# Altium schematic symbol library jlcpcb_2025_04_resistors_extended_2512.schlib: 2667 symbols (part 10 of 14) (continued)
## RC-12K302JT
designator R?  Resistance: 3kΩ  (hidden comment: *)
Resistor, 3kΩ, ±5%, 1W, ±100ppm/℃, SMD 2512; Manufacturer: Uniroyal; Manufacturer Part Number: RC-12K302JT; Supplier 1: LCSC; Supplier Part Number 1: C453450; JLCPCB Part Number: C453450; Power Rating: 1W; Category: Resistors; Package Size: 2512; JLCPCB Basic Part: Yes; Tolerance: ±5%; Temperature Coefficient: ±100ppm/℃; ComponentLink1Description: Datasheet; ComponentLink1URL: https://wmsc.lcsc.com/wmsc/upload/file/pdf/v2/lcsc/2304140030_FH--Guangdong-Fenghua-Advanced-Tech-RC-12K302JT_C453450.pdf; ComponentLink2Description: JLCPCB Part URL; ComponentLink2URL: https://jlcpcb.com/partdetail/C453450
pins: 1, 2
1 alternate drawing of the same symbol

## RC-12K303JT
designator R?  Resistance: 30kΩ  (hidden comment: *)
Resistor, 30kΩ, ±5%, 1W, ±100ppm/℃, SMD 2512; Manufacturer: Uniroyal; Manufacturer Part Number: RC-12K303JT; Supplier 1: LCSC; Supplier Part Number 1: C453451; JLCPCB Part Number: C453451; Power Rating: 1W; Category: Resistors; Package Size: 2512; JLCPCB Basic Part: Yes; Tolerance: ±5%; Temperature Coefficient: ±100ppm/℃; ComponentLink1Description: Datasheet; ComponentLink1URL: https://wmsc.lcsc.com/wmsc/upload/file/pdf/v2/lcsc/2304140030_FH--Guangdong-Fenghua-Advanced-Tech-RC-12K303JT_C453451.pdf; ComponentLink2Description: JLCPCB Part URL; ComponentLink2URL: https://jlcpcb.com/partdetail/C453451
pins: 1, 2
1 alternate drawing of the same symbol

## RC-12K304JT
designator R?  Resistance: 300kΩ  (hidden comment: *)
Resistor, 300kΩ, ±5%, 1W, ±100ppm/℃, SMD 2512; Manufacturer: Uniroyal; Manufacturer Part Number: RC-12K304JT; Supplier 1: LCSC; Supplier Part Number 1: C453452; JLCPCB Part Number: C453452; Power Rating: 1W; Category: Resistors; Package Size: 2512; JLCPCB Basic Part: Yes; Tolerance: ±5%; Temperature Coefficient: ±100ppm/℃; ComponentLink1Description: Datasheet; ComponentLink1URL: https://wmsc.lcsc.com/wmsc/upload/file/pdf/v2/lcsc/2304140030_FH--Guangdong-Fenghua-Advanced-Tech-RC-12K304JT_C453452.pdf; ComponentLink2Description: JLCPCB Part URL; ComponentLink2URL: https://jlcpcb.com/partdetail/C453452
pins: 1, 2
1 alternate drawing of the same symbol

## RC-12K330JT
designator R?  Resistance: 33Ω  (hidden comment: *)
Resistor, 33Ω, ±5%, 1W, 200V, ±100ppm/℃, -55℃~+155℃, SMD 2512; Manufacturer: Uniroyal; Manufacturer Part Number: RC-12K330JT; Supplier 1: LCSC; Supplier Part Number 1: C453458; JLCPCB Part Number: C453458; Power Rating: 1W; Category: Resistors; Package Size: 2512; JLCPCB Basic Part: Yes; Tolerance: ±5%; Voltage Rating: 200V; Temperature Coefficient: ±100ppm/℃; Temperature Rating: -55℃~+155℃; ComponentLink1Description: Datasheet; ComponentLink1URL: https://wmsc.lcsc.com/wmsc/upload/file/pdf/v2/lcsc/2304140030_FH--Guangdong-Fenghua-Advanced-Tech-RC-12K330JT_C453458.pdf; ComponentLink2Description: JLCPCB Part URL; ComponentLink2URL: https://jlcpcb.com/partdetail/C453458
pins: 1, 2
1 alternate drawing of the same symbol

## RC-12K331JT
designator R?  Resistance: 330Ω  (hidden comment: *)
Resistor, 330Ω, ±5%, 1W, ±100ppm/℃, SMD 2512; Manufacturer: Uniroyal; Manufacturer Part Number: RC-12K331JT; Supplier 1: LCSC; Supplier Part Number 1: C304648; JLCPCB Part Number: C304648; Power Rating: 1W; Category: Resistors; Package Size: 2512; JLCPCB Basic Part: Yes; Tolerance: ±5%; Temperature Coefficient: ±100ppm/℃; ComponentLink1Description: Datasheet; ComponentLink1URL: https://wmsc.lcsc.com/wmsc/upload/file/pdf/v2/lcsc/2304140030_FH--Guangdong-Fenghua-Advanced-Tech-RC-12K331JT_C304648.pdf; ComponentLink2Description: JLCPCB Part URL; ComponentLink2URL: https://jlcpcb.com/partdetail/C304648
pins: 1, 2
1 alternate drawing of the same symbol

## RC-12K332JT
designator R?  Resistance: 3.3kΩ  (hidden comment: *)
Resistor, 3.3kΩ, ±5%, 1W, ±100ppm/℃, SMD 2512; Manufacturer: Uniroyal; Manufacturer Part Number: RC-12K332JT; Supplier 1: LCSC; Supplier Part Number 1: C453989; JLCPCB Part Number: C453989; Power Rating: 1W; Category: Resistors; Package Size: 2512; JLCPCB Basic Part: Yes; Tolerance: ±5%; Temperature Coefficient: ±100ppm/℃; ComponentLink1Description: Datasheet; ComponentLink1URL: https://wmsc.lcsc.com/wmsc/upload/file/pdf/v2/lcsc/2304140030_FH--Guangdong-Fenghua-Advanced-Tech-RC-12K332JT_C453989.pdf; ComponentLink2Description: JLCPCB Part URL; ComponentLink2URL: https://jlcpcb.com/partdetail/C453989
pins: 1, 2
1 alternate drawing of the same symbol

## RC-12K333JT
designator R?  Resistance: 33kΩ  (hidden comment: *)
Resistor, 33kΩ, ±5%, 1W, ±100ppm/℃, SMD 2512; Manufacturer: Uniroyal; Manufacturer Part Number: RC-12K333JT; Supplier 1: LCSC; Supplier Part Number 1: C453990; JLCPCB Part Number: C453990; Power Rating: 1W; Category: Resistors; Package Size: 2512; JLCPCB Basic Part: Yes; Tolerance: ±5%; Temperature Coefficient: ±100ppm/℃; ComponentLink1Description: Datasheet; ComponentLink1URL: https://wmsc.lcsc.com/wmsc/upload/file/pdf/v2/lcsc/2304140030_FH--Guangdong-Fenghua-Advanced-Tech-RC-12K333JT_C453990.pdf; ComponentLink2Description: JLCPCB Part URL; ComponentLink2URL: https://jlcpcb.com/partdetail/C453990
pins: 1, 2
1 alternate drawing of the same symbol

## RC-12K334JT
designator R?  Resistance: 330kΩ  (hidden comment: *)
Resistor, 330kΩ, ±5%, 1W, ±100ppm/℃, SMD 2512; Manufacturer: Uniroyal; Manufacturer Part Number: RC-12K334JT; Supplier 1: LCSC; Supplier Part Number 1: C453991; JLCPCB Part Number: C453991; Power Rating: 1W; Category: Resistors; Package Size: 2512; JLCPCB Basic Part: Yes; Tolerance: ±5%; Temperature Coefficient: ±100ppm/℃; ComponentLink1Description: Datasheet; ComponentLink1URL: https://wmsc.lcsc.com/wmsc/upload/file/pdf/v2/lcsc/2304140030_FH--Guangdong-Fenghua-Advanced-Tech-RC-12K334JT_C453991.pdf; ComponentLink2Description: JLCPCB Part URL; ComponentLink2URL: https://jlcpcb.com/partdetail/C453991
pins: 1, 2
1 alternate drawing of the same symbol

## RC-12K361JT
designator R?  Resistance: 360Ω  (hidden comment: *)
Resistor, 360Ω, ±5%, 1W, 200V, ±100ppm/℃, -55℃~+155℃, SMD 2512; Manufacturer: Uniroyal; Manufacturer Part Number: RC-12K361JT; Supplier 1: LCSC; Supplier Part Number 1: C575453; JLCPCB Part Number: C575453; Power Rating: 1W; Category: Resistors; Package Size: 2512; JLCPCB Basic Part: Yes; Tolerance: ±5%; Voltage Rating: 200V; Temperature Coefficient: ±100ppm/℃; Temperature Rating: -55℃~+155℃; ComponentLink1Description: Datasheet; ComponentLink2Description: JLCPCB Part URL; ComponentLink2URL: https://jlcpcb.com/partdetail/C575453
pins: 1, 2
1 alternate drawing of the same symbol

## RC-12K362JT
designator R?  Resistance: 3.6kΩ  (hidden comment: *)
Resistor, 3.6kΩ, ±5%, 1W, ±100ppm/℃, SMD 2512; Manufacturer: Uniroyal; Manufacturer Part Number: RC-12K362JT; Supplier 1: LCSC; Supplier Part Number 1: C453993; JLCPCB Part Number: C453993; Power Rating: 1W; Category: Resistors; Package Size: 2512; JLCPCB Basic Part: Yes; Tolerance: ±5%; Temperature Coefficient: ±100ppm/℃; ComponentLink1Description: Datasheet; ComponentLink1URL: https://wmsc.lcsc.com/wmsc/upload/file/pdf/v2/lcsc/2304140030_FH--Guangdong-Fenghua-Advanced-Tech-RC-12K362JT_C453993.pdf; ComponentLink2Description: JLCPCB Part URL; ComponentLink2URL: https://jlcpcb.com/partdetail/C453993
pins: 1, 2
1 alternate drawing of the same symbol

## RC-12K363JT
designator R?  Resistance: 36kΩ  (hidden comment: *)
Resistor, 36kΩ, ±5%, 1W, ±100ppm/℃, SMD 2512; Manufacturer: Uniroyal; Manufacturer Part Number: RC-12K363JT; Supplier 1: LCSC; Supplier Part Number 1: C453994; JLCPCB Part Number: C453994; Power Rating: 1W; Category: Resistors; Package Size: 2512; JLCPCB Basic Part: Yes; Tolerance: ±5%; Temperature Coefficient: ±100ppm/℃; ComponentLink1Description: Datasheet; ComponentLink1URL: https://wmsc.lcsc.com/wmsc/upload/file/pdf/v2/lcsc/2304140030_FH--Guangdong-Fenghua-Advanced-Tech-RC-12K363JT_C453994.pdf; ComponentLink2Description: JLCPCB Part URL; ComponentLink2URL: https://jlcpcb.com/partdetail/C453994
pins: 1, 2
1 alternate drawing of the same symbol

## RC-12K390JT
designator R?  Resistance: 39Ω  (hidden comment: *)
Resistor, 39Ω, ±5%, 1W, ±100ppm/℃, SMD 2512; Manufacturer: Uniroyal; Manufacturer Part Number: RC-12K390JT; Supplier 1: LCSC; Supplier Part Number 1: C454001; JLCPCB Part Number: C454001; Power Rating: 1W; Category: Resistors; Package Size: 2512; JLCPCB Basic Part: Yes; Tolerance: ±5%; Temperature Coefficient: ±100ppm/℃; ComponentLink1Description: Datasheet; ComponentLink1URL: https://wmsc.lcsc.com/wmsc/upload/file/pdf/v2/lcsc/2304140030_FH--Guangdong-Fenghua-Advanced-Tech-RC-12K390JT_C454001.pdf; ComponentLink2Description: JLCPCB Part URL; ComponentLink2URL: https://jlcpcb.com/partdetail/C454001
pins: 1, 2
1 alternate drawing of the same symbol

## RC-12K391JT
designator R?  Resistance: 390Ω  (hidden comment: *)
Resistor, 390Ω, ±5%, 1W, ±100ppm/℃, SMD 2512; Manufacturer: Uniroyal; Manufacturer Part Number: RC-12K391JT; Supplier 1: LCSC; Supplier Part Number 1: C454002; JLCPCB Part Number: C454002; Power Rating: 1W; Category: Resistors; Package Size: 2512; JLCPCB Basic Part: Yes; Tolerance: ±5%; Temperature Coefficient: ±100ppm/℃; ComponentLink1Description: Datasheet; ComponentLink1URL: https://wmsc.lcsc.com/wmsc/upload/file/pdf/v2/lcsc/2304140030_FH--Guangdong-Fenghua-Advanced-Tech-RC-12K391JT_C454002.pdf; ComponentLink2Description: JLCPCB Part URL; ComponentLink2URL: https://jlcpcb.com/partdetail/C454002
pins: 1, 2
1 alternate drawing of the same symbol

## RC-12K392JT
designator R?  Resistance: 3.9kΩ  (hidden comment: *)
Resistor, 3.9kΩ, ±5%, 1W, ±100ppm/℃, SMD 2512; Manufacturer: Uniroyal; Manufacturer Part Number: RC-12K392JT; Supplier 1: LCSC; Supplier Part Number 1: C454003; JLCPCB Part Number: C454003; Power Rating: 1W; Category: Resistors; Package Size: 2512; JLCPCB Basic Part: Yes; Tolerance: ±5%; Temperature Coefficient: ±100ppm/℃; ComponentLink1Description: Datasheet; ComponentLink1URL: https://wmsc.lcsc.com/wmsc/upload/file/pdf/v2/lcsc/2304140030_FH--Guangdong-Fenghua-Advanced-Tech-RC-12K392JT_C454003.pdf; ComponentLink2Description: JLCPCB Part URL; ComponentLink2URL: https://jlcpcb.com/partdetail/C454003
pins: 1, 2
1 alternate drawing of the same symbol

## RC-12K393JT
designator R?  Resistance: 39kΩ  (hidden comment: *)
Resistor, 39kΩ, ±5%, 1W, ±100ppm/℃, SMD 2512; Manufacturer: Uniroyal; Manufacturer Part Number: RC-12K393JT; Supplier 1: LCSC; Supplier Part Number 1: C454004; JLCPCB Part Number: C454004; Power Rating: 1W; Category: Resistors; Package Size: 2512; JLCPCB Basic Part: Yes; Tolerance: ±5%; Temperature Coefficient: ±100ppm/℃; ComponentLink1Description: Datasheet; ComponentLink1URL: https://wmsc.lcsc.com/wmsc/upload/file/pdf/v2/lcsc/2304140030_FH--Guangdong-Fenghua-Advanced-Tech-RC-12K393JT_C454004.pdf; ComponentLink2Description: JLCPCB Part URL; ComponentLink2URL: https://jlcpcb.com/partdetail/C454004
pins: 1, 2
1 alternate drawing of the same symbol

## RC-12K430JT
designator R?  Resistance: 43Ω  (hidden comment: *)
Resistor, 43Ω, ±5%, 1W, ±100ppm/℃, SMD 2512; Manufacturer: Uniroyal; Manufacturer Part Number: RC-12K430JT; Supplier 1: LCSC; Supplier Part Number 1: C454008; JLCPCB Part Number: C454008; Power Rating: 1W; Category: Resistors; Package Size: 2512; JLCPCB Basic Part: Yes; Tolerance: ±5%; Temperature Coefficient: ±100ppm/℃; ComponentLink1Description: Datasheet; ComponentLink1URL: https://wmsc.lcsc.com/wmsc/upload/file/pdf/v2/lcsc/2304140030_FH--Guangdong-Fenghua-Advanced-Tech-RC-12K430JT_C454008.pdf; ComponentLink2Description: JLCPCB Part URL; ComponentLink2URL: https://jlcpcb.com/partdetail/C454008
pins: 1, 2
1 alternate drawing of the same symbol

## RC-12K431JT
designator R?  Resistance: 430Ω  (hidden comment: *)
Resistor, 430Ω, ±5%, 1W, ±100ppm/℃, SMD 2512; Manufacturer: Uniroyal; Manufacturer Part Number: RC-12K431JT; Supplier 1: LCSC; Supplier Part Number 1: C304649; JLCPCB Part Number: C304649; Power Rating: 1W; Category: Resistors; Package Size: 2512; JLCPCB Basic Part: Yes; Tolerance: ±5%; Temperature Coefficient: ±100ppm/℃; ComponentLink1Description: Datasheet; ComponentLink1URL: https://wmsc.lcsc.com/wmsc/upload/file/pdf/v2/lcsc/2304140030_FH--Guangdong-Fenghua-Advanced-Tech-RC-12K431JT_C304649.pdf; ComponentLink2Description: JLCPCB Part URL; ComponentLink2URL: https://jlcpcb.com/partdetail/C304649
pins: 1, 2
1 alternate drawing of the same symbol

## RC-12K432JT
designator R?  Resistance: 4.3kΩ  (hidden comment: *)
Resistor, 4.3kΩ, ±5%, 1W, ±100ppm/℃, SMD 2512; Manufacturer: Uniroyal; Manufacturer Part Number: RC-12K432JT; Supplier 1: LCSC; Supplier Part Number 1: C454009; JLCPCB Part Number: C454009; Power Rating: 1W; Category: Resistors; Package Size: 2512; JLCPCB Basic Part: Yes; Tolerance: ±5%; Temperature Coefficient: ±100ppm/℃; ComponentLink1Description: Datasheet; ComponentLink1URL: https://wmsc.lcsc.com/wmsc/upload/file/pdf/v2/lcsc/2304140030_FH--Guangdong-Fenghua-Advanced-Tech-RC-12K432JT_C454009.pdf; ComponentLink2Description: JLCPCB Part URL; ComponentLink2URL: https://jlcpcb.com/partdetail/C454009
pins: 1, 2
1 alternate drawing of the same symbol

## RC-12K433JT
designator R?  Resistance: 43kΩ  (hidden comment: *)
Resistor, 43kΩ, ±5%, 1W, ±100ppm/℃, SMD 2512; Manufacturer: Uniroyal; Manufacturer Part Number: RC-12K433JT; Supplier 1: LCSC; Supplier Part Number 1: C454010; JLCPCB Part Number: C454010; Power Rating: 1W; Category: Resistors; Package Size: 2512; JLCPCB Basic Part: Yes; Tolerance: ±5%; Temperature Coefficient: ±100ppm/℃; ComponentLink1Description: Datasheet; ComponentLink1URL: https://wmsc.lcsc.com/wmsc/upload/file/pdf/v2/lcsc/2304140030_FH--Guangdong-Fenghua-Advanced-Tech-RC-12K433JT_C454010.pdf; ComponentLink2Description: JLCPCB Part URL; ComponentLink2URL: https://jlcpcb.com/partdetail/C454010
pins: 1, 2
1 alternate drawing of the same symbol

## RC-12K470JT
designator R?  Resistance: 47Ω  (hidden comment: *)
Resistor, 47Ω, ±5%, 1W, ±100ppm/℃, SMD 2512; Manufacturer: Uniroyal; Manufacturer Part Number: RC-12K470JT; Supplier 1: LCSC; Supplier Part Number 1: C341654; JLCPCB Part Number: C341654; Power Rating: 1W; Category: Resistors; Package Size: 2512; JLCPCB Basic Part: Yes; Tolerance: ±5%; Temperature Coefficient: ±100ppm/℃; ComponentLink1Description: Datasheet; ComponentLink1URL: https://wmsc.lcsc.com/wmsc/upload/file/pdf/v2/lcsc/2304140030_FH--Guangdong-Fenghua-Advanced-Tech-RC-12K470JT_C341654.pdf; ComponentLink2Description: JLCPCB Part URL; ComponentLink2URL: https://jlcpcb.com/partdetail/C341654
pins: 1, 2
1 alternate drawing of the same symbol

## RC-12K471JT
designator R?  Resistance: 470Ω  (hidden comment: *)
Resistor, 470Ω, ±5%, 1W, ±100ppm/℃, SMD 2512; Manufacturer: Uniroyal; Manufacturer Part Number: RC-12K471JT; Supplier 1: LCSC; Supplier Part Number 1: C341655; JLCPCB Part Number: C341655; Power Rating: 1W; Category: Resistors; Package Size: 2512; JLCPCB Basic Part: Yes; Tolerance: ±5%; Temperature Coefficient: ±100ppm/℃; ComponentLink1Description: Datasheet; ComponentLink1URL: https://wmsc.lcsc.com/wmsc/upload/file/pdf/v2/lcsc/2304140030_FH--Guangdong-Fenghua-Advanced-Tech-RC-12K471JT_C341655.pdf; ComponentLink2Description: JLCPCB Part URL; ComponentLink2URL: https://jlcpcb.com/partdetail/C341655
pins: 1, 2
1 alternate drawing of the same symbol

## RC-12K472JT
designator R?  Resistance: 4.7kΩ  (hidden comment: *)
Resistor, 4.7kΩ, ±5%, 1W, ±100ppm/℃, SMD 2512; Manufacturer: Uniroyal; Manufacturer Part Number: RC-12K472JT; Supplier 1: LCSC; Supplier Part Number 1: C454015; JLCPCB Part Number: C454015; Power Rating: 1W; Category: Resistors; Package Size: 2512; JLCPCB Basic Part: Yes; Tolerance: ±5%; Temperature Coefficient: ±100ppm/℃; ComponentLink1Description: Datasheet; ComponentLink1URL: https://wmsc.lcsc.com/wmsc/upload/file/pdf/v2/lcsc/2304140030_FH--Guangdong-Fenghua-Advanced-Tech-RC-12K472JT_C454015.pdf; ComponentLink2Description: JLCPCB Part URL; ComponentLink2URL: https://jlcpcb.com/partdetail/C454015
pins: 1, 2
1 alternate drawing of the same symbol

## RC-12K473JT
designator R?  Resistance: 47kΩ  (hidden comment: *)
Resistor, 47kΩ, ±5%, 1W, ±100ppm/℃, SMD 2512; Manufacturer: Uniroyal; Manufacturer Part Number: RC-12K473JT; Supplier 1: LCSC; Supplier Part Number 1: C341656; JLCPCB Part Number: C341656; Power Rating: 1W; Category: Resistors; Package Size: 2512; JLCPCB Basic Part: Yes; Tolerance: ±5%; Temperature Coefficient: ±100ppm/℃; ComponentLink1Description: Datasheet; ComponentLink1URL: https://wmsc.lcsc.com/wmsc/upload/file/pdf/v2/lcsc/2304140030_FH--Guangdong-Fenghua-Advanced-Tech-RC-12K473JT_C341656.pdf; ComponentLink2Description: JLCPCB Part URL; ComponentLink2URL: https://jlcpcb.com/partdetail/C341656
pins: 1, 2
1 alternate drawing of the same symbol

## RC-12K474JT
designator R?  Resistance: 470kΩ  (hidden comment: *)
Resistor, 470kΩ, ±5%, 1W, ±100ppm/℃, SMD 2512; Manufacturer: Uniroyal; Manufacturer Part Number: RC-12K474JT; Supplier 1: LCSC; Supplier Part Number 1: C454016; JLCPCB Part Number: C454016; Power Rating: 1W; Category: Resistors; Package Size: 2512; JLCPCB Basic Part: Yes; Tolerance: ±5%; Temperature Coefficient: ±100ppm/℃; ComponentLink1Description: Datasheet; ComponentLink1URL: https://wmsc.lcsc.com/wmsc/upload/file/pdf/v2/lcsc/2304140030_FH--Guangdong-Fenghua-Advanced-Tech-RC-12K474JT_C454016.pdf; ComponentLink2Description: JLCPCB Part URL; ComponentLink2URL: https://jlcpcb.com/partdetail/C454016
pins: 1, 2
1 alternate drawing of the same symbol

## RC-12K510JT
designator R?  Resistance: 51Ω  (hidden comment: *)
Resistor, 51Ω, ±5%, 1W, ±100ppm/℃, SMD 2512; Manufacturer: Uniroyal; Manufacturer Part Number: RC-12K510JT; Supplier 1: LCSC; Supplier Part Number 1: C327434; JLCPCB Part Number: C327434; Power Rating: 1W; Category: Resistors; Package Size: 2512; JLCPCB Basic Part: Yes; Tolerance: ±5%; Temperature Coefficient: ±100ppm/℃; ComponentLink1Description: Datasheet; ComponentLink1URL: https://wmsc.lcsc.com/wmsc/upload/file/pdf/v2/lcsc/2304140030_FH--Guangdong-Fenghua-Advanced-Tech-RC-12K510JT_C327434.pdf; ComponentLink2Description: JLCPCB Part URL; ComponentLink2URL: https://jlcpcb.com/partdetail/C327434
pins: 1, 2
1 alternate drawing of the same symbol

## RC-12K511JT
designator R?  Resistance: 510Ω  (hidden comment: *)
Resistor, 510Ω, ±5%, 1W, ±100ppm/℃, SMD 2512; Manufacturer: Uniroyal; Manufacturer Part Number: RC-12K511JT; Supplier 1: LCSC; Supplier Part Number 1: C454028; JLCPCB Part Number: C454028; Power Rating: 1W; Category: Resistors; Package Size: 2512; JLCPCB Basic Part: Yes; Tolerance: ±5%; Temperature Coefficient: ±100ppm/℃; ComponentLink1Description: Datasheet; ComponentLink1URL: https://wmsc.lcsc.com/wmsc/upload/file/pdf/v2/lcsc/2304140030_FH--Guangdong-Fenghua-Advanced-Tech-RC-12K511JT_C454028.pdf; ComponentLink2Description: JLCPCB Part URL; ComponentLink2URL: https://jlcpcb.com/partdetail/C454028
pins: 1, 2
1 alternate drawing of the same symbol

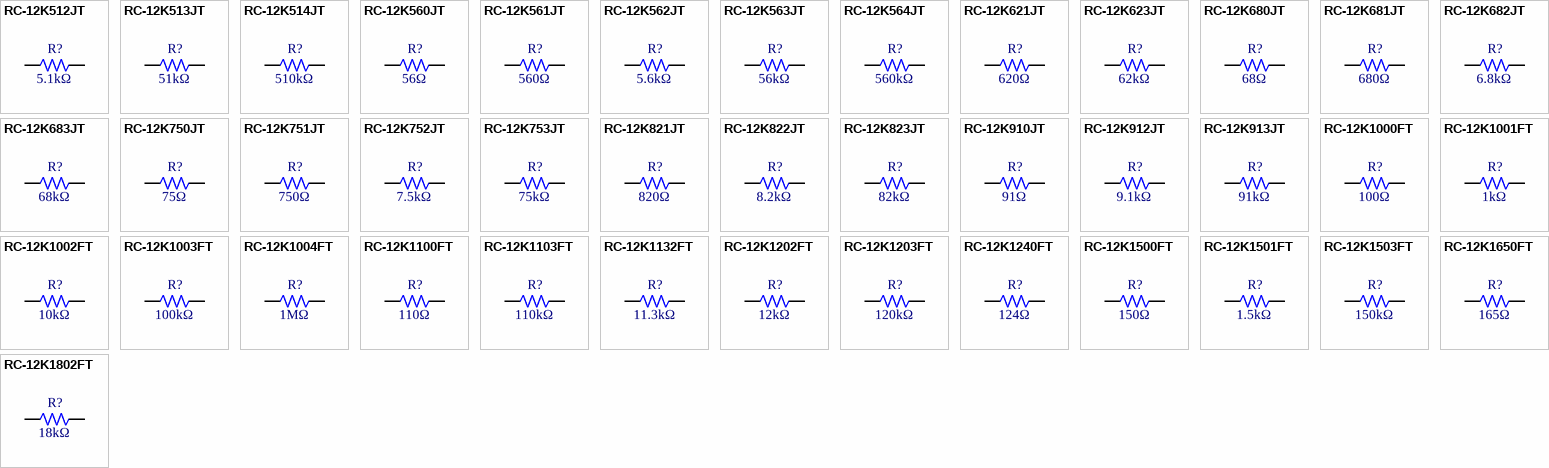
[diagram p49: symbols RC-12K512JT to RC-12K1802FT]

## RC-12K512JT
designator R?  Resistance: 5.1kΩ  (hidden comment: *)
Resistor, 5.1kΩ, ±5%, 1W, 200V, ±100ppm/℃, -55℃~+155℃, SMD 2512; Manufacturer: Uniroyal; Manufacturer Part Number: RC-12K512JT; Supplier 1: LCSC; Supplier Part Number 1: C310404; JLCPCB Part Number: C310404; Power Rating: 1W; Category: Resistors; Package Size: 2512; JLCPCB Basic Part: Yes; Tolerance: ±5%; Voltage Rating: 200V; Temperature Coefficient: ±100ppm/℃; Temperature Rating: -55℃~+155℃; ComponentLink1Description: Datasheet; ComponentLink1URL: https://wmsc.lcsc.com/wmsc/upload/file/pdf/v2/lcsc/2304140030_FH--Guangdong-Fenghua-Advanced-Tech-RC-12K512JT_C310404.pdf; ComponentLink2Description: JLCPCB Part URL; ComponentLink2URL: https://jlcpcb.com/partdetail/C310404
pins: 1, 2
1 alternate drawing of the same symbol

## RC-12K513JT
designator R?  Resistance: 51kΩ  (hidden comment: *)
Resistor, 51kΩ, ±5%, 1W, ±100ppm/℃, SMD 2512; Manufacturer: Uniroyal; Manufacturer Part Number: RC-12K513JT; Supplier 1: LCSC; Supplier Part Number 1: C327444; JLCPCB Part Number: C327444; Power Rating: 1W; Category: Resistors; Package Size: 2512; JLCPCB Basic Part: Yes; Tolerance: ±5%; Temperature Coefficient: ±100ppm/℃; ComponentLink1Description: Datasheet; ComponentLink1URL: https://wmsc.lcsc.com/wmsc/upload/file/pdf/v2/lcsc/2304140030_FH--Guangdong-Fenghua-Advanced-Tech-RC-12K513JT_C327444.pdf; ComponentLink2Description: JLCPCB Part URL; ComponentLink2URL: https://jlcpcb.com/partdetail/C327444
pins: 1, 2
1 alternate drawing of the same symbol

## RC-12K514JT
designator R?  Resistance: 510kΩ  (hidden comment: *)
Resistor, 510kΩ, ±5%, 1W, ±100ppm/℃, SMD 2512; Manufacturer: Uniroyal; Manufacturer Part Number: RC-12K514JT; Supplier 1: LCSC; Supplier Part Number 1: C454029; JLCPCB Part Number: C454029; Power Rating: 1W; Category: Resistors; Package Size: 2512; JLCPCB Basic Part: Yes; Tolerance: ±5%; Temperature Coefficient: ±100ppm/℃; ComponentLink1Description: Datasheet; ComponentLink1URL: https://wmsc.lcsc.com/wmsc/upload/file/pdf/v2/lcsc/2304140030_FH--Guangdong-Fenghua-Advanced-Tech-RC-12K514JT_C454029.pdf; ComponentLink2Description: JLCPCB Part URL; ComponentLink2URL: https://jlcpcb.com/partdetail/C454029
pins: 1, 2
1 alternate drawing of the same symbol

## RC-12K560JT
designator R?  Resistance: 56Ω  (hidden comment: *)
Resistor, 56Ω, ±5%, 1W, ±100ppm/℃, SMD 2512; Manufacturer: Uniroyal; Manufacturer Part Number: RC-12K560JT; Supplier 1: LCSC; Supplier Part Number 1: C454033; JLCPCB Part Number: C454033; Power Rating: 1W; Category: Resistors; Package Size: 2512; JLCPCB Basic Part: Yes; Tolerance: ±5%; Temperature Coefficient: ±100ppm/℃; ComponentLink1Description: Datasheet; ComponentLink1URL: https://wmsc.lcsc.com/wmsc/upload/file/pdf/v2/lcsc/2304140030_FH--Guangdong-Fenghua-Advanced-Tech-RC-12K560JT_C454033.pdf; ComponentLink2Description: JLCPCB Part URL; ComponentLink2URL: https://jlcpcb.com/partdetail/C454033
pins: 1, 2
1 alternate drawing of the same symbol

## RC-12K561JT
designator R?  Resistance: 560Ω  (hidden comment: *)
Resistor, 560Ω, ±5%, 1W, ±100ppm/℃, SMD 2512; Manufacturer: Uniroyal; Manufacturer Part Number: RC-12K561JT; Supplier 1: LCSC; Supplier Part Number 1: C454034; JLCPCB Part Number: C454034; Power Rating: 1W; Category: Resistors; Package Size: 2512; JLCPCB Basic Part: Yes; Tolerance: ±5%; Temperature Coefficient: ±100ppm/℃; ComponentLink1Description: Datasheet; ComponentLink1URL: https://wmsc.lcsc.com/wmsc/upload/file/pdf/v2/lcsc/2304140030_FH--Guangdong-Fenghua-Advanced-Tech-RC-12K561JT_C454034.pdf; ComponentLink2Description: JLCPCB Part URL; ComponentLink2URL: https://jlcpcb.com/partdetail/C454034
pins: 1, 2
1 alternate drawing of the same symbol

## RC-12K562JT
designator R?  Resistance: 5.6kΩ  (hidden comment: *)
Resistor, 5.6kΩ, ±5%, 1W, ±100ppm/℃, SMD 2512; Manufacturer: Uniroyal; Manufacturer Part Number: RC-12K562JT; Supplier 1: LCSC; Supplier Part Number 1: C454035; JLCPCB Part Number: C454035; Power Rating: 1W; Category: Resistors; Package Size: 2512; JLCPCB Basic Part: Yes; Tolerance: ±5%; Temperature Coefficient: ±100ppm/℃; ComponentLink1Description: Datasheet; ComponentLink1URL: https://wmsc.lcsc.com/wmsc/upload/file/pdf/v2/lcsc/2304140030_FH--Guangdong-Fenghua-Advanced-Tech-RC-12K562JT_C454035.pdf; ComponentLink2Description: JLCPCB Part URL; ComponentLink2URL: https://jlcpcb.com/partdetail/C454035
pins: 1, 2
1 alternate drawing of the same symbol

## RC-12K563JT
designator R?  Resistance: 56kΩ  (hidden comment: *)
Resistor, 56kΩ, ±5%, 1W, ±100ppm/℃, SMD 2512; Manufacturer: Uniroyal; Manufacturer Part Number: RC-12K563JT; Supplier 1: LCSC; Supplier Part Number 1: C454036; JLCPCB Part Number: C454036; Power Rating: 1W; Category: Resistors; Package Size: 2512; JLCPCB Basic Part: Yes; Tolerance: ±5%; Temperature Coefficient: ±100ppm/℃; ComponentLink1Description: Datasheet; ComponentLink1URL: https://wmsc.lcsc.com/wmsc/upload/file/pdf/v2/lcsc/2304140030_FH--Guangdong-Fenghua-Advanced-Tech-RC-12K563JT_C454036.pdf; ComponentLink2Description: JLCPCB Part URL; ComponentLink2URL: https://jlcpcb.com/partdetail/C454036
pins: 1, 2
1 alternate drawing of the same symbol

## RC-12K564JT
designator R?  Resistance: 560kΩ  (hidden comment: *)
Resistor, 560kΩ, ±5%, 1W, ±100ppm/℃, SMD 2512; Manufacturer: Uniroyal; Manufacturer Part Number: RC-12K564JT; Supplier 1: LCSC; Supplier Part Number 1: C454037; JLCPCB Part Number: C454037; Power Rating: 1W; Category: Resistors; Package Size: 2512; JLCPCB Basic Part: Yes; Tolerance: ±5%; Temperature Coefficient: ±100ppm/℃; ComponentLink1Description: Datasheet; ComponentLink1URL: https://wmsc.lcsc.com/wmsc/upload/file/pdf/v2/lcsc/2304140030_FH--Guangdong-Fenghua-Advanced-Tech-RC-12K564JT_C454037.pdf; ComponentLink2Description: JLCPCB Part URL; ComponentLink2URL: https://jlcpcb.com/partdetail/C454037
pins: 1, 2
1 alternate drawing of the same symbol

## RC-12K621JT
designator R?  Resistance: 620Ω  (hidden comment: *)
Resistor, 620Ω, ±5%, 1W, ±100ppm/℃, SMD 2512; Manufacturer: Uniroyal; Manufacturer Part Number: RC-12K621JT; Supplier 1: LCSC; Supplier Part Number 1: C454041; JLCPCB Part Number: C454041; Power Rating: 1W; Category: Resistors; Package Size: 2512; JLCPCB Basic Part: Yes; Tolerance: ±5%; Temperature Coefficient: ±100ppm/℃; ComponentLink1Description: Datasheet; ComponentLink1URL: https://wmsc.lcsc.com/wmsc/upload/file/pdf/v2/lcsc/2304140030_FH--Guangdong-Fenghua-Advanced-Tech-RC-12K621JT_C454041.pdf; ComponentLink2Description: JLCPCB Part URL; ComponentLink2URL: https://jlcpcb.com/partdetail/C454041
pins: 1, 2
1 alternate drawing of the same symbol

## RC-12K623JT
designator R?  Resistance: 62kΩ  (hidden comment: *)
Resistor, 62kΩ, ±5%, 1W, ±100ppm/℃, SMD 2512; Manufacturer: Uniroyal; Manufacturer Part Number: RC-12K623JT; Supplier 1: LCSC; Supplier Part Number 1: C454043; JLCPCB Part Number: C454043; Power Rating: 1W; Category: Resistors; Package Size: 2512; JLCPCB Basic Part: Yes; Tolerance: ±5%; Temperature Coefficient: ±100ppm/℃; ComponentLink1Description: Datasheet; ComponentLink1URL: https://wmsc.lcsc.com/wmsc/upload/file/pdf/v2/lcsc/2304140030_FH--Guangdong-Fenghua-Advanced-Tech-RC-12K623JT_C454043.pdf; ComponentLink2Description: JLCPCB Part URL; ComponentLink2URL: https://jlcpcb.com/partdetail/C454043
pins: 1, 2
1 alternate drawing of the same symbol

## RC-12K680JT
designator R?  Resistance: 68Ω  (hidden comment: *)
Resistor, 68Ω, ±5%, 1W, ±100ppm/℃, SMD 2512; Manufacturer: Uniroyal; Manufacturer Part Number: RC-12K680JT; Supplier 1: LCSC; Supplier Part Number 1: C327435; JLCPCB Part Number: C327435; Power Rating: 1W; Category: Resistors; Package Size: 2512; JLCPCB Basic Part: Yes; Tolerance: ±5%; Temperature Coefficient: ±100ppm/℃; ComponentLink1Description: Datasheet; ComponentLink1URL: https://wmsc.lcsc.com/wmsc/upload/file/pdf/v2/lcsc/2304140030_FH--Guangdong-Fenghua-Advanced-Tech-RC-12K680JT_C327435.pdf; ComponentLink2Description: JLCPCB Part URL; ComponentLink2URL: https://jlcpcb.com/partdetail/C327435
pins: 1, 2
1 alternate drawing of the same symbol

## RC-12K681JT
designator R?  Resistance: 680Ω  (hidden comment: *)
Resistor, 680Ω, ±5%, 1W, ±100ppm/℃, SMD 2512; Manufacturer: Uniroyal; Manufacturer Part Number: RC-12K681JT; Supplier 1: LCSC; Supplier Part Number 1: C454049; JLCPCB Part Number: C454049; Power Rating: 1W; Category: Resistors; Package Size: 2512; JLCPCB Basic Part: Yes; Tolerance: ±5%; Temperature Coefficient: ±100ppm/℃; ComponentLink1Description: Datasheet; ComponentLink1URL: https://wmsc.lcsc.com/wmsc/upload/file/pdf/v2/lcsc/2304140030_FH--Guangdong-Fenghua-Advanced-Tech-RC-12K681JT_C454049.pdf; ComponentLink2Description: JLCPCB Part URL; ComponentLink2URL: https://jlcpcb.com/partdetail/C454049
pins: 1, 2
1 alternate drawing of the same symbol

## RC-12K682JT
designator R?  Resistance: 6.8kΩ  (hidden comment: *)
Resistor, 6.8kΩ, ±5%, 1W, ±100ppm/℃, SMD 2512; Manufacturer: Uniroyal; Manufacturer Part Number: RC-12K682JT; Supplier 1: LCSC; Supplier Part Number 1: C454050; JLCPCB Part Number: C454050; Power Rating: 1W; Category: Resistors; Package Size: 2512; JLCPCB Basic Part: Yes; Tolerance: ±5%; Temperature Coefficient: ±100ppm/℃; ComponentLink1Description: Datasheet; ComponentLink1URL: https://wmsc.lcsc.com/wmsc/upload/file/pdf/v2/lcsc/2304140030_FH--Guangdong-Fenghua-Advanced-Tech-RC-12K682JT_C454050.pdf; ComponentLink2Description: JLCPCB Part URL; ComponentLink2URL: https://jlcpcb.com/partdetail/C454050
pins: 1, 2
1 alternate drawing of the same symbol

## RC-12K683JT
designator R?  Resistance: 68kΩ  (hidden comment: *)
Resistor, 68kΩ, ±5%, 1W, ±100ppm/℃, SMD 2512; Manufacturer: Uniroyal; Manufacturer Part Number: RC-12K683JT; Supplier 1: LCSC; Supplier Part Number 1: C454051; JLCPCB Part Number: C454051; Power Rating: 1W; Category: Resistors; Package Size: 2512; JLCPCB Basic Part: Yes; Tolerance: ±5%; Temperature Coefficient: ±100ppm/℃; ComponentLink1Description: Datasheet; ComponentLink1URL: https://wmsc.lcsc.com/wmsc/upload/file/pdf/v2/lcsc/2304140030_FH--Guangdong-Fenghua-Advanced-Tech-RC-12K683JT_C454051.pdf; ComponentLink2Description: JLCPCB Part URL; ComponentLink2URL: https://jlcpcb.com/partdetail/C454051
pins: 1, 2
1 alternate drawing of the same symbol

## RC-12K750JT
designator R?  Resistance: 75Ω  (hidden comment: *)
Resistor, 75Ω, ±5%, 1W, 200V, ±100ppm/℃, -55℃~+155℃, SMD 2512; Manufacturer: Uniroyal; Manufacturer Part Number: RC-12K750JT; Supplier 1: LCSC; Supplier Part Number 1: C454055; JLCPCB Part Number: C454055; Power Rating: 1W; Category: Resistors; Package Size: 2512; JLCPCB Basic Part: Yes; Tolerance: ±5%; Voltage Rating: 200V; Temperature Coefficient: ±100ppm/℃; Temperature Rating: -55℃~+155℃; ComponentLink1Description: Datasheet; ComponentLink1URL: https://wmsc.lcsc.com/wmsc/upload/file/pdf/v2/lcsc/2304140030_FH--Guangdong-Fenghua-Advanced-Tech-RC-12K750JT_C454055.pdf; ComponentLink2Description: JLCPCB Part URL; ComponentLink2URL: https://jlcpcb.com/partdetail/C454055
pins: 1, 2
1 alternate drawing of the same symbol

## RC-12K751JT
designator R?  Resistance: 750Ω  (hidden comment: *)
Resistor, 750Ω, ±5%, 1W, ±100ppm/℃, SMD 2512; Manufacturer: Uniroyal; Manufacturer Part Number: RC-12K751JT; Supplier 1: LCSC; Supplier Part Number 1: C454056; JLCPCB Part Number: C454056; Power Rating: 1W; Category: Resistors; Package Size: 2512; JLCPCB Basic Part: Yes; Tolerance: ±5%; Temperature Coefficient: ±100ppm/℃; ComponentLink1Description: Datasheet; ComponentLink1URL: https://wmsc.lcsc.com/wmsc/upload/file/pdf/v2/lcsc/2304140030_FH--Guangdong-Fenghua-Advanced-Tech-RC-12K751JT_C454056.pdf; ComponentLink2Description: JLCPCB Part URL; ComponentLink2URL: https://jlcpcb.com/partdetail/C454056
pins: 1, 2
1 alternate drawing of the same symbol

## RC-12K752JT
designator R?  Resistance: 7.5kΩ  (hidden comment: *)
Resistor, 7.5kΩ, ±5%, 1W, ±100ppm/℃, SMD 2512; Manufacturer: Uniroyal; Manufacturer Part Number: RC-12K752JT; Supplier 1: LCSC; Supplier Part Number 1: C454057; JLCPCB Part Number: C454057; Power Rating: 1W; Category: Resistors; Package Size: 2512; JLCPCB Basic Part: Yes; Tolerance: ±5%; Temperature Coefficient: ±100ppm/℃; ComponentLink1Description: Datasheet; ComponentLink1URL: https://wmsc.lcsc.com/wmsc/upload/file/pdf/v2/lcsc/2304140030_FH--Guangdong-Fenghua-Advanced-Tech-RC-12K752JT_C454057.pdf; ComponentLink2Description: JLCPCB Part URL; ComponentLink2URL: https://jlcpcb.com/partdetail/C454057
pins: 1, 2
1 alternate drawing of the same symbol

## RC-12K753JT
designator R?  Resistance: 75kΩ  (hidden comment: *)
Resistor, 75kΩ, ±5%, 1W, ±100ppm/℃, SMD 2512; Manufacturer: Uniroyal; Manufacturer Part Number: RC-12K753JT; Supplier 1: LCSC; Supplier Part Number 1: C454058; JLCPCB Part Number: C454058; Power Rating: 1W; Category: Resistors; Package Size: 2512; JLCPCB Basic Part: Yes; Tolerance: ±5%; Temperature Coefficient: ±100ppm/℃; ComponentLink1Description: Datasheet; ComponentLink1URL: https://wmsc.lcsc.com/wmsc/upload/file/pdf/v2/lcsc/2304140030_FH--Guangdong-Fenghua-Advanced-Tech-RC-12K753JT_C454058.pdf; ComponentLink2Description: JLCPCB Part URL; ComponentLink2URL: https://jlcpcb.com/partdetail/C454058
pins: 1, 2
1 alternate drawing of the same symbol

## RC-12K821JT
designator R?  Resistance: 820Ω  (hidden comment: *)
Resistor, 820Ω, ±5%, 1W, ±100ppm/℃, SMD 2512; Manufacturer: Uniroyal; Manufacturer Part Number: RC-12K821JT; Supplier 1: LCSC; Supplier Part Number 1: C304650; JLCPCB Part Number: C304650; Power Rating: 1W; Category: Resistors; Package Size: 2512; JLCPCB Basic Part: Yes; Tolerance: ±5%; Temperature Coefficient: ±100ppm/℃; ComponentLink1Description: Datasheet; ComponentLink1URL: https://wmsc.lcsc.com/wmsc/upload/file/pdf/v2/lcsc/2304140030_FH--Guangdong-Fenghua-Advanced-Tech-RC-12K821JT_C304650.pdf; ComponentLink2Description: JLCPCB Part URL; ComponentLink2URL: https://jlcpcb.com/partdetail/C304650
pins: 1, 2
1 alternate drawing of the same symbol

## RC-12K822JT
designator R?  Resistance: 8.2kΩ  (hidden comment: *)
Resistor, 8.2kΩ, ±5%, 1W, ±100ppm/℃, SMD 2512; Manufacturer: Uniroyal; Manufacturer Part Number: RC-12K822JT; Supplier 1: LCSC; Supplier Part Number 1: C454062; JLCPCB Part Number: C454062; Power Rating: 1W; Category: Resistors; Package Size: 2512; JLCPCB Basic Part: Yes; Tolerance: ±5%; Temperature Coefficient: ±100ppm/℃; ComponentLink1Description: Datasheet; ComponentLink1URL: https://wmsc.lcsc.com/wmsc/upload/file/pdf/v2/lcsc/2304140030_FH--Guangdong-Fenghua-Advanced-Tech-RC-12K822JT_C454062.pdf; ComponentLink2Description: JLCPCB Part URL; ComponentLink2URL: https://jlcpcb.com/partdetail/C454062
pins: 1, 2
1 alternate drawing of the same symbol

## RC-12K823JT
designator R?  Resistance: 82kΩ  (hidden comment: *)
Resistor, 82kΩ, ±5%, 1W, ±100ppm/℃, SMD 2512; Manufacturer: Uniroyal; Manufacturer Part Number: RC-12K823JT; Supplier 1: LCSC; Supplier Part Number 1: C304651; JLCPCB Part Number: C304651; Power Rating: 1W; Category: Resistors; Package Size: 2512; JLCPCB Basic Part: Yes; Tolerance: ±5%; Temperature Coefficient: ±100ppm/℃; ComponentLink1Description: Datasheet; ComponentLink1URL: https://wmsc.lcsc.com/wmsc/upload/file/pdf/v2/lcsc/2304140030_FH--Guangdong-Fenghua-Advanced-Tech-RC-12K823JT_C304651.pdf; ComponentLink2Description: JLCPCB Part URL; ComponentLink2URL: https://jlcpcb.com/partdetail/C304651
pins: 1, 2
1 alternate drawing of the same symbol

## RC-12K910JT
designator R?  Resistance: 91Ω  (hidden comment: *)
Resistor, 91Ω, ±5%, 1W, ±100ppm/℃, SMD 2512; Manufacturer: Uniroyal; Manufacturer Part Number: RC-12K910JT; Supplier 1: LCSC; Supplier Part Number 1: C454067; JLCPCB Part Number: C454067; Power Rating: 1W; Category: Resistors; Package Size: 2512; JLCPCB Basic Part: Yes; Tolerance: ±5%; Temperature Coefficient: ±100ppm/℃; ComponentLink1Description: Datasheet; ComponentLink1URL: https://wmsc.lcsc.com/wmsc/upload/file/pdf/v2/lcsc/2304140030_FH--Guangdong-Fenghua-Advanced-Tech-RC-12K910JT_C454067.pdf; ComponentLink2Description: JLCPCB Part URL; ComponentLink2URL: https://jlcpcb.com/partdetail/C454067
pins: 1, 2
1 alternate drawing of the same symbol

## RC-12K912JT
designator R?  Resistance: 9.1kΩ  (hidden comment: *)
Resistor, 9.1kΩ, ±5%, 1W, ±100ppm/℃, SMD 2512; Manufacturer: Uniroyal; Manufacturer Part Number: RC-12K912JT; Supplier 1: LCSC; Supplier Part Number 1: C454069; JLCPCB Part Number: C454069; Power Rating: 1W; Category: Resistors; Package Size: 2512; JLCPCB Basic Part: Yes; Tolerance: ±5%; Temperature Coefficient: ±100ppm/℃; ComponentLink1Description: Datasheet; ComponentLink1URL: https://wmsc.lcsc.com/wmsc/upload/file/pdf/v2/lcsc/2304140030_FH--Guangdong-Fenghua-Advanced-Tech-RC-12K912JT_C454069.pdf; ComponentLink2Description: JLCPCB Part URL; ComponentLink2URL: https://jlcpcb.com/partdetail/C454069
pins: 1, 2
1 alternate drawing of the same symbol

## RC-12K913JT
designator R?  Resistance: 91kΩ  (hidden comment: *)
Resistor, 91kΩ, ±5%, 1W, ±100ppm/℃, SMD 2512; Manufacturer: Uniroyal; Manufacturer Part Number: RC-12K913JT; Supplier 1: LCSC; Supplier Part Number 1: C454070; JLCPCB Part Number: C454070; Power Rating: 1W; Category: Resistors; Package Size: 2512; JLCPCB Basic Part: Yes; Tolerance: ±5%; Temperature Coefficient: ±100ppm/℃; ComponentLink1Description: Datasheet; ComponentLink1URL: https://wmsc.lcsc.com/wmsc/upload/file/pdf/v2/lcsc/2304140030_FH--Guangdong-Fenghua-Advanced-Tech-RC-12K913JT_C454070.pdf; ComponentLink2Description: JLCPCB Part URL; ComponentLink2URL: https://jlcpcb.com/partdetail/C454070
pins: 1, 2
1 alternate drawing of the same symbol

## RC-12K1000FT
designator R?  Resistance: 100Ω  (hidden comment: *)
Resistor, 100Ω, ±1%, 1W, ±100ppm/℃, SMD 2512; Manufacturer: Uniroyal; Manufacturer Part Number: RC-12K1000FT; Supplier 1: LCSC; Supplier Part Number 1: C723332; JLCPCB Part Number: C723332; Power Rating: 1W; Category: Resistors; Package Size: 2512; JLCPCB Basic Part: Yes; Tolerance: ±1%; Temperature Coefficient: ±100ppm/℃; ComponentLink1Description: Datasheet; ComponentLink1URL: https://wmsc.lcsc.com/wmsc/upload/file/pdf/v2/lcsc/2304140030_FH--Guangdong-Fenghua-Advanced-Tech-RC-12K1000FT_C723332.pdf; ComponentLink2Description: JLCPCB Part URL; ComponentLink2URL: https://jlcpcb.com/partdetail/C723332
pins: 1, 2
1 alternate drawing of the same symbol

## RC-12K1001FT
designator R?  Resistance: 1kΩ  (hidden comment: *)
Resistor, 1kΩ, ±1%, 1W, ±100ppm/℃, SMD 2512; Manufacturer: Uniroyal; Manufacturer Part Number: RC-12K1001FT; Supplier 1: LCSC; Supplier Part Number 1: C453362; JLCPCB Part Number: C453362; Power Rating: 1W; Category: Resistors; Package Size: 2512; JLCPCB Basic Part: Yes; Tolerance: ±1%; Temperature Coefficient: ±100ppm/℃; ComponentLink1Description: Datasheet; ComponentLink1URL: https://wmsc.lcsc.com/wmsc/upload/file/pdf/v2/lcsc/2304140030_FH--Guangdong-Fenghua-Advanced-Tech-RC-12K1001FT_C453362.pdf; ComponentLink2Description: JLCPCB Part URL; ComponentLink2URL: https://jlcpcb.com/partdetail/C453362
pins: 1, 2
1 alternate drawing of the same symbol

## RC-12K1002FT
designator R?  Resistance: 10kΩ  (hidden comment: *)
Resistor, 10kΩ, ±1%, 1W, 200V, ±100ppm/℃, -55℃~+155℃, SMD 2512; Manufacturer: Uniroyal; Manufacturer Part Number: RC-12K1002FT; Supplier 1: LCSC; Supplier Part Number 1: C2991655; JLCPCB Part Number: C2991655; Power Rating: 1W; Category: Resistors; Package Size: 2512; JLCPCB Basic Part: Yes; Tolerance: ±1%; Voltage Rating: 200V; Temperature Coefficient: ±100ppm/℃; Temperature Rating: -55℃~+155℃; ComponentLink1Description: Datasheet; ComponentLink1URL: https://wmsc.lcsc.com/wmsc/upload/file/pdf/v2/lcsc/2204111630_FH--Guangdong-Fenghua-Advanced-Tech-RC-12K1002FT_C2991655.pdf; ComponentLink2Description: JLCPCB Part URL; ComponentLink2URL: https://jlcpcb.com/partdetail/C2991655
pins: 1, 2
1 alternate drawing of the same symbol

## RC-12K1003FT
designator R?  Resistance: 100kΩ  (hidden comment: *)
Resistor, 100kΩ, ±1%, 1W, ±100ppm/℃, SMD 2512; Manufacturer: Uniroyal; Manufacturer Part Number: RC-12K1003FT; Supplier 1: LCSC; Supplier Part Number 1: C453363; JLCPCB Part Number: C453363; Power Rating: 1W; Category: Resistors; Package Size: 2512; JLCPCB Basic Part: Yes; Tolerance: ±1%; Temperature Coefficient: ±100ppm/℃; ComponentLink1Description: Datasheet; ComponentLink1URL: https://wmsc.lcsc.com/wmsc/upload/file/pdf/v2/lcsc/2304140030_FH--Guangdong-Fenghua-Advanced-Tech-RC-12K1003FT_C453363.pdf; ComponentLink2Description: JLCPCB Part URL; ComponentLink2URL: https://jlcpcb.com/partdetail/C453363
pins: 1, 2
1 alternate drawing of the same symbol

## RC-12K1004FT
designator R?  Resistance: 1MΩ  (hidden comment: *)
Resistor, 1MΩ, ±1%, 1W, ±100ppm/℃, SMD 2512; Manufacturer: Uniroyal; Manufacturer Part Number: RC-12K1004FT; Supplier 1: LCSC; Supplier Part Number 1: C575452; JLCPCB Part Number: C575452; Power Rating: 1W; Category: Resistors; Package Size: 2512; JLCPCB Basic Part: Yes; Tolerance: ±1%; Temperature Coefficient: ±100ppm/℃; ComponentLink1Description: Datasheet; ComponentLink1URL: https://wmsc.lcsc.com/wmsc/upload/file/pdf/v2/lcsc/2304140030_FH--Guangdong-Fenghua-Advanced-Tech-RC-12K1004FT_C575452.pdf; ComponentLink2Description: JLCPCB Part URL; ComponentLink2URL: https://jlcpcb.com/partdetail/C575452
pins: 1, 2
1 alternate drawing of the same symbol

## RC-12K1100FT
designator R?  Resistance: 110Ω  (hidden comment: *)
Resistor, 110Ω, ±1%, 1W, ±100ppm/℃, SMD 2512; Manufacturer: Uniroyal; Manufacturer Part Number: RC-12K1100FT; Supplier 1: LCSC; Supplier Part Number 1: C453366; JLCPCB Part Number: C453366; Power Rating: 1W; Category: Resistors; Package Size: 2512; JLCPCB Basic Part: Yes; Tolerance: ±1%; Temperature Coefficient: ±100ppm/℃; ComponentLink1Description: Datasheet; ComponentLink1URL: https://wmsc.lcsc.com/wmsc/upload/file/pdf/v2/lcsc/2304140030_FH--Guangdong-Fenghua-Advanced-Tech-RC-12K1100FT_C453366.pdf; ComponentLink2Description: JLCPCB Part URL; ComponentLink2URL: https://jlcpcb.com/partdetail/C453366
pins: 1, 2
1 alternate drawing of the same symbol

## RC-12K1103FT
designator R?  Resistance: 110kΩ  (hidden comment: *)
Resistor, 110kΩ, ±1%, 1W, ±100ppm/℃, SMD 2512; Manufacturer: Uniroyal; Manufacturer Part Number: RC-12K1103FT; Supplier 1: LCSC; Supplier Part Number 1: C453367; JLCPCB Part Number: C453367; Power Rating: 1W; Category: Resistors; Package Size: 2512; JLCPCB Basic Part: Yes; Tolerance: ±1%; Temperature Coefficient: ±100ppm/℃; ComponentLink1Description: Datasheet; ComponentLink1URL: https://wmsc.lcsc.com/wmsc/upload/file/pdf/v2/lcsc/2304140030_FH--Guangdong-Fenghua-Advanced-Tech-RC-12K1103FT_C453367.pdf; ComponentLink2Description: JLCPCB Part URL; ComponentLink2URL: https://jlcpcb.com/partdetail/C453367
pins: 1, 2
1 alternate drawing of the same symbol

## RC-12K1132FT
designator R?  Resistance: 11.3kΩ  (hidden comment: *)
Resistor, 11.3kΩ, ±1%, 1W, ±100ppm/℃, SMD 2512; Manufacturer: Uniroyal; Manufacturer Part Number: RC-12K1132FT; Supplier 1: LCSC; Supplier Part Number 1: C453370; JLCPCB Part Number: C453370; Power Rating: 1W; Category: Resistors; Package Size: 2512; JLCPCB Basic Part: Yes; Tolerance: ±1%; Temperature Coefficient: ±100ppm/℃; ComponentLink1Description: Datasheet; ComponentLink1URL: https://wmsc.lcsc.com/wmsc/upload/file/pdf/v2/lcsc/2304140030_FH--Guangdong-Fenghua-Advanced-Tech-RC-12K1132FT_C453370.pdf; ComponentLink2Description: JLCPCB Part URL; ComponentLink2URL: https://jlcpcb.com/partdetail/C453370
pins: 1, 2
1 alternate drawing of the same symbol